# Altium footprint library Main_Board.PcbLib: 106 footprints (part 2 of 7)
Each footprint in its own frame and in the unit in brackets; x right, y up, seen from the top. Pads: shape width x height; smd on the part's side, far side on the other; paste and mask are expansions set on the pad; w line width, h text height; cw(c..) or ccw(c..) is an arc to the next point about the centre after c.
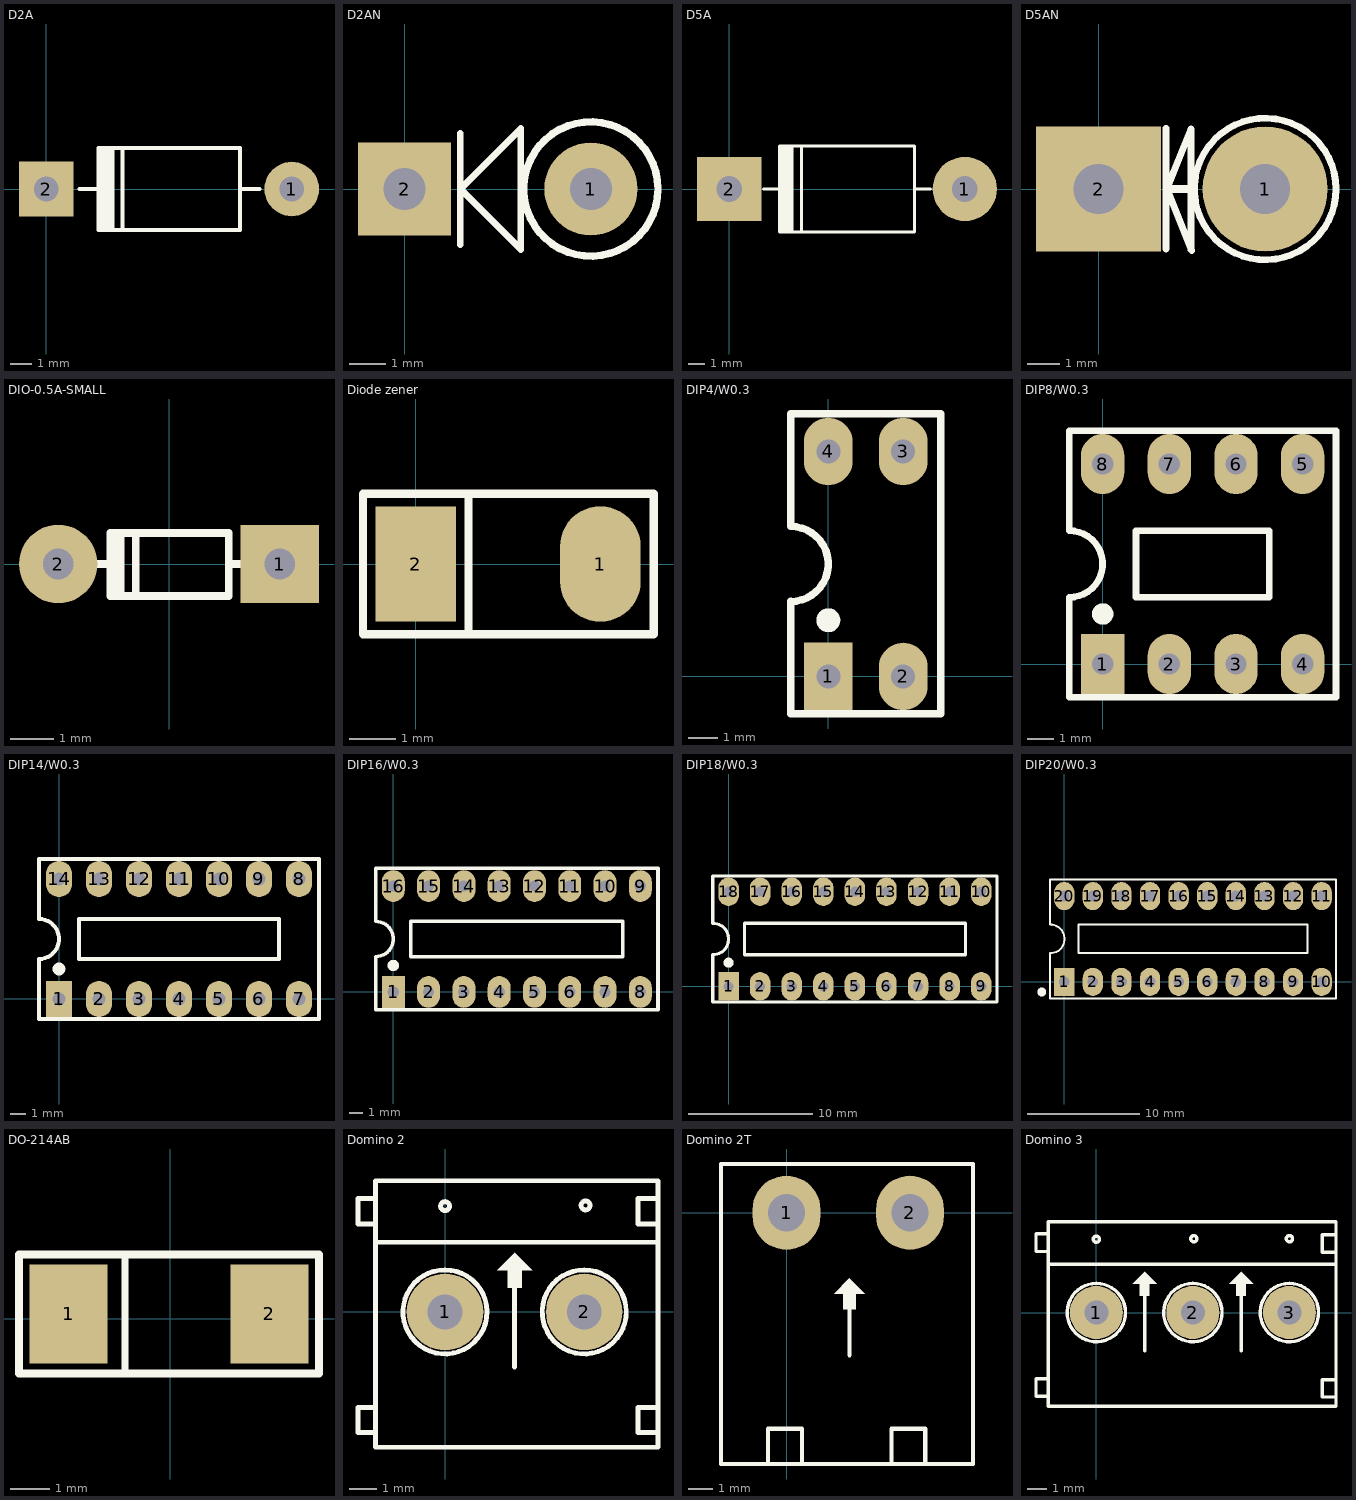
[diagram p1: the footprints below, top view; thin cyan lines are the x and y axes]

## D2A [mil] "Diode 2A, W 150mil, L 450mil"
height 100
pads (2):
  round 100 hole 45: 1(450,0)
  rect 100x100 hole 45: 2(0,0)
Top Overlay:
  rectangle: 95,-75 125,75
  lines w7: 61,0 96,0 ; 96,-31 96,0 ; 96,32 96,0 ; 140,-75 140,75 ; 355,0 391,0 ; 96,-75 96,75 355,75 355,-75 96,-75
3D body: height 100.5, standoff -100, extent 5,-47 435,54

## D2AN [mil] "Diode 2A, W 150mil, L 450mil"
height 100
pads (2):
  round 100 hole 45: 1(200,0)
  rect 100x100 hole 45: 2(0,0)
Top Overlay:
  circle w8: c200,0 r72.11
  lines w7: 60,-60 60,60 ; 125,50 125,65 60,0 125,-65 125,55
3D body: height 252.32, standoff -78.14, extent 46.01,-49.99 214.01,55

## D5A [mil] "Diode 5A, W 200mil, L 550mil"
height 150
pads (2):
  round 150 hole 60: 1(550,0)
  rect 150x150 hole 60: 2(0,0)
Top Overlay:
  rectangle: 120,-100 150,100
  lines w7: 80,0 118,0 ; 118,-44 118,0 ; 118,46 118,0 ; 169,-99 169,100 ; 432,0 470,0 ; 118,-100 118,100 432,100 432,-100 118,-100
3D body: height 254.33, standoff -86.22, extent -51.87,-106 589.87,102.66

## D5AN [mil] "Diode 5A, W 200mil, L 250mil"
height 150
pads (2):
  round 150 hole 60: 1(200,0)
  rect 150x150 hole 60: 2(0,0)
Top Overlay:
  circle w8: c200,0 r85
  lines w8: 81,-72 81,73 ; 82,0 111,72 111,-73 ; 83,-2 112,-74
  lines w10: 82,0 113,0
3D body: height 252.32, standoff -78.14, extent 21,-73.99 189,31

## DIO-0.5A-SMALL [mm] "Diode muoi, W 80mil, L 300mil"
height 2.032
pads (2):
  rect 1.8x1.8 hole 0.7: 1(2.54,0)
  round 1.8 hole 0.7: 2(-2.54,0)
Top Overlay:
  rectangle: -1.397,-0.762 -1.016,0.635
  lines w0.178: -2.032,0 -1.346,0 ; -0.762,-0.737 -0.762,0.711 ; 1.372,0 2.032,0 ; -1.346,-0.737 -1.346,0.711 1.372,0.711 1.372,-0.737 -1.346,-0.737
3D body: height 1.68, standoff -1.14, extent -2.756,-0.837 2.756,0.813

## Diode zener [mm] "Silicon Planar Zener Diodes"
pads (2):
  oval 1.75x2.5 smd: 1(4,0)
  rect 1.75x2.5 smd: 2(0,0)
Top Overlay:
  lines w0.178: 1.143,-1.524 1.143,1.524 ; -1.143,-1.524 5.156,-1.524 5.156,1.524 -1.143,1.524 -1.143,-1.524

## DIP4/W0.3 [mil] "4 PIN, W 300mil, Pin to pin 100mil"
height 100
pads (4):
  rect 65x90 hole 32: 1(0,0)
  oval 65x90 hole 32: 2(100,0) 3(100,300) 4(0,300)
Top Overlay:
  circle w16: c0,75 r8
  lines w10: -50,-50 -50,100 ccw(c-50,150) -50,200 -50,350 150,350 150,-50 -50,-50
3D body: height 169.69, standoff -129.13, extent -60.04,-8.86 158.07,306.1

## DIP8/W0.3 [mil] "8 PIN, W 300mil, Pin to pin 100mil"
height 100
pads (8):
  rect 65x90 hole 32: 1(0,0)
  oval 65x90 hole 32: 2(100,0) 3(200,0) 4(300,0) 5(300,300) 6(200,300) 7(100,300) 8(0,300)
Top Overlay:
  circle w16: c0,75 r8
  lines w10: -50,-50 -50,100 ccw(c-50,150) -50,200 -50,350 350,350 350,-50 -50,-50 ; 50,100 250,100 250,200 50,200 50,100
3D body: height 210, standoff -150, extent -50.01,-8.8 349.99,305.2

## DIP14/W0.3 [mil] "14PIN, W 300mil, Pin to pin 100mil"
height 100
pads (14):
  rect 65x90 hole 32: 1(0,0)
  oval 65x90 hole 32: 2(100,0) 3(200,0) 4(300,0) 5(400,0) 6(500,0) 7(600,0) 8(600,300) 9(500,300) 10(400,300) 11(300,300) 12(200,300) 13(100,300) 14(0,300)
Top Overlay:
  circle w16: c0,75 r8
  lines w10: -50,-50 650,-50 650,350 -50,350 -50,200 cw(c-50,150) -50,100 -50,-50 ; 50,100 550,100 550,200 50,200 50,100
3D body: height 145.48, standoff -129.32, extent -69.99,-12.47 680.01,302.49

## DIP16/W0.3 [mil] "16 PIN, W 300mil, Pin to pin 100mil"
height 100
pads (16):
  rect 65x90 hole 32: 1(0,0)
  oval 65x90 hole 32: 2(100,0) 3(200,0) 4(300,0) 5(400,0) 6(500,0) 7(600,0) 8(700,0) 9(700,300) 10(600,300) 11(500,300) 12(400,300) 13(300,300) 14(200,300) 15(100,300) 16(0,300)
Top Overlay:
  circle w16: c0,75 r8
  lines w10: -50,349 -49,350 ; -50,-50 -50,100 ccw(c-50,150) -50,200 -50,350 750,350 750,-50 -50,-50 ; 50,100 650,100 650,200 50,200 50,100
3D body: height 210, standoff -150, extent -51,-5.99 749,308.01

## DIP18/W0.3 [mil] "18 PIN, W 300mil, Pin to pin 100mil"
height 100
pads (18):
  rect 65x90 hole 32: 1(0,0)
  oval 65x90 hole 32: 2(100,0) 3(200,0) 4(300,0) 5(400,0) 6(500,0) 7(600,0) 8(700,0) 9(800,0) 10(800,300) 11(700,300) 12(600,300) 13(500,300) 14(400,300) 15(300,300) 16(200,300) 17(100,300) 18(0,300)
Top Overlay:
  circle w16: c0,75 r8
  lines w10: -50,-50 -50,100 ccw(c-50,150) -50,200 -50,350 850,350 850,-50 -50,-50 ; 50,100 50,200 750,200 750,100 50,100
3D body: height 210, standoff -150, extent -60,-5.99 860,308.01

## DIP20/W0.3 [mm] "DIP 20, 20 PIN, W 300mil, Pin to pin 100mil"
height 2.54
pads (20):
  rect 1.8x2.5 hole 0.95: 1(0,0)
  oval 1.8x2.5 hole 0.95: 2(2.54,0) 3(5.08,0) 4(7.62,0) 5(10.16,0) 6(12.7,0) 7(15.24,0) 8(17.78,0) 9(20.32,0) 10(22.86,0) 11(22.86,7.62) 12(20.32,7.62) 13(17.78,7.62) 14(15.24,7.62) 15(12.7,7.62) 16(10.16,7.62) 17(7.62,7.62) 18(5.08,7.62) 19(2.54,7.62) 20(0,7.62)
Top Overlay:
  circle w0.381: c-2,-0.9 r0.203
  lines w0.178: -1.28,2.541 ccw(c-1.237,3.81) -1.27,5.08 ; -1.27,2.54 -1.27,-1.47 24.13,-1.47 24.13,9.08 -1.27,9.08 -1.27,5.105 ; 1.27,2.54 1.27,5.08 21.59,5.08 21.59,2.54 1.27,2.54
3D body: height 5.33, standoff -3.81, extent -2.022,-0.168 24.902,7.808

## DO-214AB [mm]
pads (2):
  rect 2x2.54 smd: 1(-2.616,0.127) 2(2.54,0.127)
Top Overlay:
  lines w0.178: -1.168,-1.397 -1.168,1.626
  lines w0.2: -3.886,-1.397 3.81,-1.397 3.81,1.651 -3.886,1.651 -3.886,-1.397
3D body: height 2.36, standoff 0.08, extent -2.616,-1.27 2.87,1.524

## Domino 2 [mil] "Domino 2, 2 pin, hight 300mil, Pin to Pin 200, Colour Green"
height 300
pads (2):
  round 110 hole 50: 1(0,0) 2(200,0)
Top Overlay:
  circle w7: c202,153 r6.4
  circle w7: c0,152 r6.4
  region: 100,85 75,60 90,60 90,35 110,35 110,60 125,60
  lines w7: -100,-173.5 -125,-173.5 -125,-137.5 -100,-137.5 ; -100,126.5 -125,126.5 -125,163 -100,163 ; -98,100 306,100 ; 38.83,46.23 ccw(c0,0) 40.11,45.12 ; 100,-79 100,72 ; 238.74,46.3 ccw(c200,0) 240.11,45.12 ; 302.5,-173.5 277.5,-173.5 277.5,-137.5 302.5,-137.5 ; 302.5,126.5 277.5,126.5 277.5,163 302.5,163 ; -100,-194.5 -100,188.5 306,188.5 306,-194.5 -100,-194.5
3D body: height 590.55, standoff -137.8, extent -121.22,-190 301.22,184.02

## Domino 2T [mil] "Domino 2T, 2 pin, hight 300mil, Pin to Pin 200, Colour Green"
height 300
pads (2):
  oval 110x120 hole 60: 1(0,0) 2(200,0)
Top Overlay:
  region: 102,-106 77,-131 92,-131 92,-156 112,-156 112,-131 127,-131
  lines w7: -30,-405 -30,-350 25,-350 25,-405 ; 102,-231 102,-156 ; 170,-405 170,-350 225,-350 225,-405 ; -106,-407 -106,79 302,79 302,-407 -106,-407
3D body: height 333.51, standoff -157.48, extent -98.85,-401.44 294.85,71

## Domino 3 [mil] "Domino 3, 3 pin, height 300mil, Pin to Pin 200, Colour Green"
height 300
pads (3):
  round 110 hole 50: 1(0,0) 2(200,0) 3(400,0)
Top Overlay:
  circle w7: c202,153 r6.4
  circle w7: c0,152 r6.4
  circle w7: c400,153 r6.4
  region: 300,85 275,60 290,60 290,35 310,35 310,60 325,60
  region: 100,85 75,60 90,60 90,35 110,35 110,60 125,60
  lines w7: -100,-173.5 -125,-173.5 -125,-137.5 -100,-137.5 ; -100,126.5 -125,126.5 -125,163 -100,163 ; -98,100 496.5,100 ; 38.83,46.23 ccw(c0,0) 40.11,45.12 ; 100,-79 100,72 ; 238.74,46.3 ccw(c200,0) 240.11,45.12 ; 300,-79 300,72 ; 438.74,46.3 ccw(c400,0) 440.11,45.12 ; 493,-175 468,-175 468,-139 493,-139 ; 493,125 468,125 468,161.5 493,161.5 ; 496.5,187 496.5,-194.5 -100,-194.5 -100,188.5 496.5,188.5
3D body: height 590.55, standoff -137.8, extent -120.99,-190.5 492,183.51